# Altium footprint library ICs And Semiconductors SMD.PcbLib: 602 footprints (part 37 of 38)
Each footprint in its own frame and in the unit in brackets; x right, y up, seen from the top. Pads: shape width x height; smd on the part's side, far side on the other; paste and mask are expansions set on the pad; w line width, h text height; cw(c..) or ccw(c..) is an arc to the next point about the centre after c.
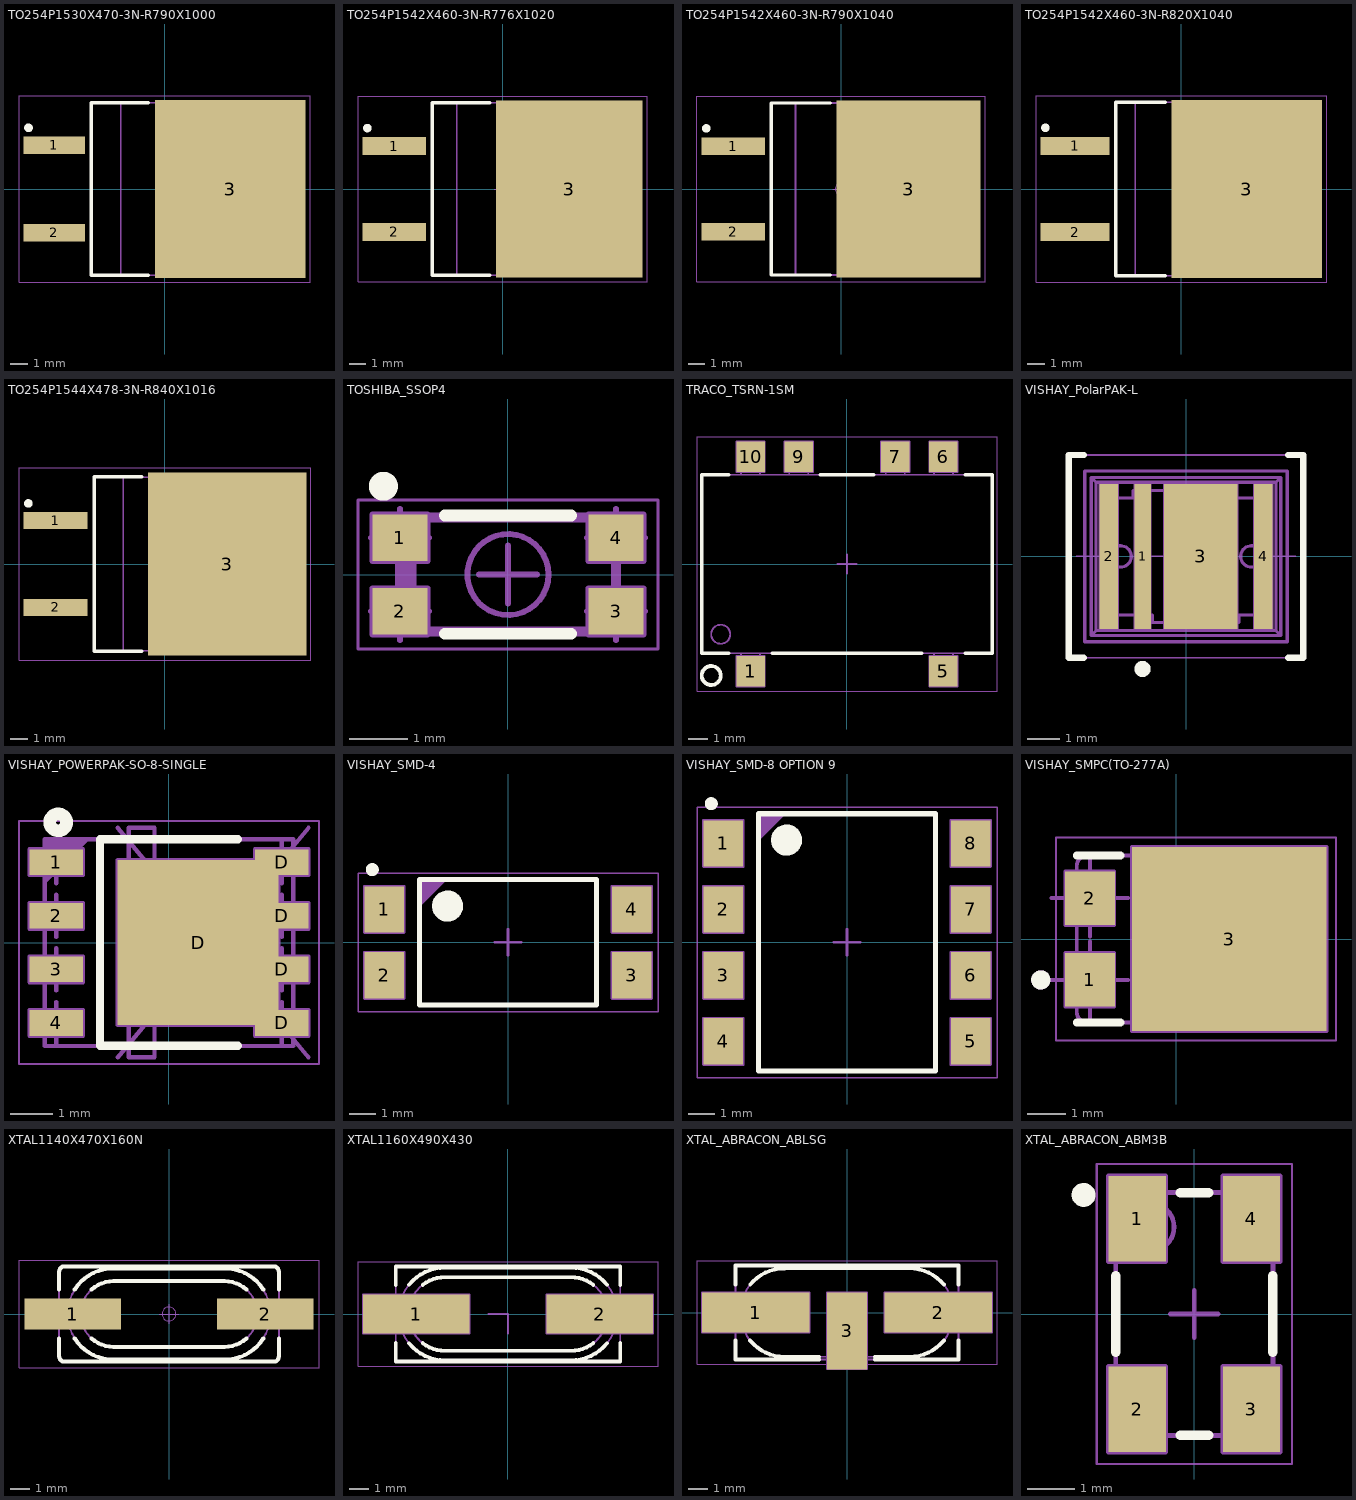
[diagram p36: the footprints below, top view; thin cyan lines are the x and y axes]

## TO254P1530X470-3N-R790X1000 [mm] "D2PAK TO-263, TO, 2.54mm pitch; 2 pin, 15.30mm L X 9.20mm W X 4.70mm H body, IPC Medium Density"
height 4.7
pads (3):
  rect 3.55x1 smd: 1(-6.4,2.54) 2(-6.4,-2.54)
  rect 8.75x10.3 smd: 3(3.8,0)
Top Overlay:
  circle w0.25: c-7.9,3.55 r0.125
  lines w0.2: -0.95,-5 -4.25,-5 -4.25,5 -0.95,5
Top Paste:
  region: 0.11,-4.45 1.43,-4.45 1.43,-2.75 0.11,-2.75
  region: 2.13,-4.45 3.45,-4.45 3.45,-2.75 2.13,-2.75
  region: 4.15,-4.45 5.47,-4.45 5.47,-2.75 4.15,-2.75
  region: 6.17,-4.45 7.49,-4.45 7.49,-2.75 6.17,-2.75
  region: 0.11,-2.05 1.43,-2.05 1.43,-0.35 0.11,-0.35
  region: 2.13,-2.05 3.45,-2.05 3.45,-0.35 2.13,-0.35
  region: 4.15,-2.05 5.47,-2.05 5.47,-0.35 4.15,-0.35
  region: 6.17,-2.05 7.49,-2.05 7.49,-0.35 6.17,-0.35
  region: 0.11,0.35 1.43,0.35 1.43,2.05 0.11,2.05
  region: 2.13,0.35 3.45,0.35 3.45,2.05 2.13,2.05
  region: 4.15,0.35 5.47,0.35 5.47,2.05 4.15,2.05
  region: 6.17,0.35 7.49,0.35 7.49,2.05 6.17,2.05
  region: 0.11,2.75 1.43,2.75 1.43,4.45 0.11,4.45
  region: 2.13,2.75 3.45,2.75 3.45,4.45 2.13,4.45
  region: 4.15,2.75 5.47,2.75 5.47,4.45 4.15,4.45
  region: 6.17,2.75 7.49,2.75 7.49,4.45 6.17,4.45
Mechanical 14:
  lines w0.1: 6.65,-5 6.98,-5 7.65,-4.258 7.65,4.258 6.98,5 6.65,5 ; 6.65,-5 6.65,5 ; 6.65,-5 -2.55,-5 -2.55,5 6.65,5
Mechanical 15:
  lines w0.05: -0.5,0 0.5,0 ; 0,-0.5 0,0.5 ; -8.45,-5.4 -8.45,5.4 8.45,5.4 8.45,-5.4 -8.45,-5.4
3D body "TO254P1524X483-3N.stp": height 4.83, standoff 0, extent -7.622,-5.08 7.623,5.08

## TO254P1542X460-3N-R776X1020 [mm] "D2PAK TO-263 TO, 2.54mm pitch; 2 pin, 15.425mm L X 9.15mm W X 4.60mm H body, IPC Medium Density"
height 4.6
pads (3):
  rect 3.75x1.05 smd: 1(-6.4,2.54) 2(-6.4,-2.54)
  rect 8.65x10.5 smd: 3(3.95,0)
Top Overlay:
  circle w0.25: c-8,3.6 r0.125
  lines w0.2: -0.75,-5.1 -4.15,-5.1 -4.15,5.1 -0.75,5.1
Top Paste:
  region: 6.3,3.26 7.6,3.26 7.6,4.66 6.3,4.66
  region: 4.3,3.26 5.6,3.26 5.6,4.66 4.3,4.66
  region: 2.3,3.26 3.6,3.26 3.6,4.66 2.3,4.66
  region: 0.3,3.26 1.6,3.26 1.6,4.66 0.3,4.66
  region: 6.3,1.28 7.6,1.28 7.6,2.68 6.3,2.68
  region: 4.3,1.28 5.6,1.28 5.6,2.68 4.3,2.68
  region: 2.3,1.28 3.6,1.28 3.6,2.68 2.3,2.68
  region: 0.3,1.28 1.6,1.28 1.6,2.68 0.3,2.68
  region: 6.3,-0.7 7.6,-0.7 7.6,0.7 6.3,0.7
  region: 4.3,-0.7 5.6,-0.7 5.6,0.7 4.3,0.7
  region: 2.3,-0.7 3.6,-0.7 3.6,0.7 2.3,0.7
  region: 0.3,-0.7 1.6,-0.7 1.6,0.7 0.3,0.7
  region: 6.3,-2.68 7.6,-2.68 7.6,-1.28 6.3,-1.28
  region: 4.3,-2.68 5.6,-2.68 5.6,-1.28 4.3,-1.28
  region: 2.3,-2.68 3.6,-2.68 3.6,-1.28 2.3,-1.28
  region: 0.3,-2.68 1.6,-2.68 1.6,-1.28 0.3,-1.28
  region: 6.3,-4.66 7.6,-4.66 7.6,-3.26 6.3,-3.26
  region: 4.3,-4.66 5.6,-4.66 5.6,-3.26 4.3,-3.26
  region: 2.3,-4.66 3.6,-4.66 3.6,-3.26 2.3,-3.26
  region: 0.3,-4.66 1.6,-4.66 1.6,-3.26 0.3,-3.26
Mechanical 14:
  lines w0.1: 6.442,-5.1 -2.708,-5.1 -2.708,5.1 6.442,5.1 ; 6.442,-5.1 6.442,5.1 ; 6.442,-5.1 6.861,-5.1 7.712,-4.157 7.712,4.157 6.861,5.1 6.442,5.1
Mechanical 15:
  lines w0.05: -0.5,0 0.5,0 ; 0,-0.5 0,0.5 ; -8.55,-5.5 8.55,-5.5 8.55,5.5 -8.55,5.5 -8.55,-5.5
3D body "TO254P1524X483-3N.stp": height 4.83, standoff 0, extent -7.622,-5.08 7.623,5.08

## TO254P1542X460-3N-R790X1040 [mm] "D2PAK TO-263, TO, 2.54mm pitch; 2 pin,15.425mm L X 9.15mm W X 4.60mm H body, IPC Medium Density"
height 4.6
pads (3):
  rect 3.75x1.05 smd: 1(-6.4,2.54) 2(-6.4,-2.54)
  rect 8.55x10.5 smd: 3(4,0)
Top Overlay:
  circle w0.25: c-8,3.6 r0.125
  lines w0.2: -0.65,-5.1 -4.15,-5.1 -4.15,5.1 -0.65,5.1
Top Paste:
  region: 0.39,-4.66 1.67,-4.66 1.67,-3.26 0.39,-3.26
  region: 2.37,-4.66 3.65,-4.66 3.65,-3.26 2.37,-3.26
  region: 4.35,-4.66 5.63,-4.66 5.63,-3.26 4.35,-3.26
  region: 6.33,-4.66 7.61,-4.66 7.61,-3.26 6.33,-3.26
  region: 0.39,-2.68 1.67,-2.68 1.67,-1.28 0.39,-1.28
  region: 2.37,-2.68 3.65,-2.68 3.65,-1.28 2.37,-1.28
  region: 4.35,-2.68 5.63,-2.68 5.63,-1.28 4.35,-1.28
  region: 6.33,-2.68 7.61,-2.68 7.61,-1.28 6.33,-1.28
  region: 0.39,-0.7 1.67,-0.7 1.67,0.7 0.39,0.7
  region: 2.37,-0.7 3.65,-0.7 3.65,0.7 2.37,0.7
  region: 4.35,-0.7 5.63,-0.7 5.63,0.7 4.35,0.7
  region: 6.33,-0.7 7.61,-0.7 7.61,0.7 6.33,0.7
  region: 0.39,1.28 1.67,1.28 1.67,2.68 0.39,2.68
  region: 2.37,1.28 3.65,1.28 3.65,2.68 2.37,2.68
  region: 4.35,1.28 5.63,1.28 5.63,2.68 4.35,2.68
  region: 6.33,1.28 7.61,1.28 7.61,2.68 6.33,2.68
  region: 0.39,3.26 1.67,3.26 1.67,4.66 0.39,4.66
  region: 2.37,3.26 3.65,3.26 3.65,4.66 2.37,4.66
  region: 4.35,3.26 5.63,3.26 5.63,4.66 4.35,4.66
  region: 6.33,3.26 7.61,3.26 7.61,4.66 6.33,4.66
Mechanical 14:
  lines w0.1: 6.442,-5.1 -2.708,-5.1 -2.708,5.1 6.442,5.1 ; 6.442,-5.1 6.442,5.1 ; 6.442,-5.1 6.861,-5.1 7.712,-4.157 7.712,4.157 6.861,5.1 6.442,5.1
Mechanical 15:
  circle w0.05: c0,0 r0.35
  lines w0.05: -0.5,0 0.5,0 ; 0,-0.5 0,0.5 ; -8.55,-5.5 8.55,-5.5 8.55,5.5 -8.55,5.5 -8.55,-5.5
3D body "TO254P1542X460-3N-R790X1040.stp": height 4.6, standoff 0, extent -7.622,-5.08 7.623,5.08

## TO254P1542X460-3N-R820X1040 [mm] "D2PAK TO-263, TO, 2.54mm pitch; 2 pin,15.425mm L X 9.15mm W X 4.60mm H body, IPC Medium Density"
height 4.6
pads (3):
  rect 4.05x1.05 smd: 1(-6.25,2.54) 2(-6.25,-2.54)
  rect 8.85x10.5 smd: 3(3.85,0)
Top Overlay:
  circle w0.25: c-8,3.6 r0.125
  lines w0.2: -0.95,-5.1 -3.85,-5.1 -3.85,5.1 -0.95,5.1
Top Paste:
  region: 6.24,3.26 7.58,3.26 7.58,4.66 6.24,4.66
  region: 4.2,3.26 5.54,3.26 5.54,4.66 4.2,4.66
  region: 2.16,3.26 3.5,3.26 3.5,4.66 2.16,4.66
  region: 0.12,3.26 1.46,3.26 1.46,4.66 0.12,4.66
  region: 6.24,1.28 7.58,1.28 7.58,2.68 6.24,2.68
  region: 4.2,1.28 5.54,1.28 5.54,2.68 4.2,2.68
  region: 2.16,1.28 3.5,1.28 3.5,2.68 2.16,2.68
  region: 0.12,1.28 1.46,1.28 1.46,2.68 0.12,2.68
  region: 6.24,-0.7 7.58,-0.7 7.58,0.7 6.24,0.7
  region: 4.2,-0.7 5.54,-0.7 5.54,0.7 4.2,0.7
  region: 2.16,-0.7 3.5,-0.7 3.5,0.7 2.16,0.7
  region: 0.12,-0.7 1.46,-0.7 1.46,0.7 0.12,0.7
  region: 6.24,-2.68 7.58,-2.68 7.58,-1.28 6.24,-1.28
  region: 4.2,-2.68 5.54,-2.68 5.54,-1.28 4.2,-1.28
  region: 2.16,-2.68 3.5,-2.68 3.5,-1.28 2.16,-1.28
  region: 0.12,-2.68 1.46,-2.68 1.46,-1.28 0.12,-1.28
  region: 6.24,-4.66 7.58,-4.66 7.58,-3.26 6.24,-3.26
  region: 4.2,-4.66 5.54,-4.66 5.54,-3.26 4.2,-3.26
  region: 2.16,-4.66 3.5,-4.66 3.5,-3.26 2.16,-3.26
  region: 0.12,-4.66 1.46,-4.66 1.46,-3.26 0.12,-3.26
Mechanical 14:
  lines w0.1: 6.442,-5.1 6.861,-5.1 7.712,-4.157 7.712,4.157 6.861,5.1 6.442,5.1 ; 6.442,-5.1 6.442,5.1 ; 6.442,-5.1 -2.708,-5.1 -2.708,5.1 6.442,5.1
Mechanical 15:
  circle w0.05: c0,0 r0.35
  lines w0.05: -0.5,0 0.5,0 ; 0,-0.5 0,0.5 ; -8.55,-5.5 -8.55,5.5 8.55,5.5 8.55,-5.5 -8.55,-5.5
3D body "TO254P1542X460-3N-R820X1040.stp": height 4.6, standoff 0, extent -7.71,-5.08 7.71,5.083

## TO254P1544X478-3N-R840X1016 [mm] "D2PAK TO-263A,TO, 2.54mm pitch; 2 pin,1 5.435mm L X 9.27mm W X 4.78mm H body, IPC Medium Density"
height 4.78
pads (3):
  rect 3.75x1 smd: 1(-6.4,2.54) 2(-6.4,-2.54)
  rect 9.3x10.75 smd: 3(3.65,0)
Top Overlay:
  circle w0.25: c-8,3.55 r0.125
  lines w0.2: -1.35,-5.1 -4.15,-5.1 -4.15,5.1 -1.35,5.1
Top Paste:
  region: 6.18,3.33 6.18,4.75 7.6,4.75 7.6,3.33
  region: 4.02,3.33 4.02,4.75 5.44,4.75 5.44,3.33
  region: 1.86,3.33 1.86,4.75 3.28,4.75 3.28,3.33
  region: -0.3,3.33 -0.3,4.75 1.12,4.75 1.12,3.33
  region: 6.18,1.31 6.18,2.73 7.6,2.73 7.6,1.31
  region: 4.02,1.31 4.02,2.73 5.44,2.73 5.44,1.31
  region: 1.86,1.31 1.86,2.73 3.28,2.73 3.28,1.31
  region: -0.3,1.31 -0.3,2.73 1.12,2.73 1.12,1.31
  region: 6.18,-0.71 6.18,0.71 7.6,0.71 7.6,-0.71
  region: 4.02,-0.71 4.02,0.71 5.44,0.71 5.44,-0.71
  region: 1.86,-0.71 1.86,0.71 3.28,0.71 3.28,-0.71
  region: -0.3,-0.71 -0.3,0.71 1.12,0.71 1.12,-0.71
  region: 6.18,-2.73 6.18,-1.31 7.6,-1.31 7.6,-2.73
  region: 4.02,-2.73 4.02,-1.31 5.44,-1.31 5.44,-2.73
  region: 1.86,-2.73 1.86,-1.31 3.28,-1.31 3.28,-2.73
  region: -0.3,-2.73 -0.3,-1.31 1.12,-1.31 1.12,-2.73
  region: 6.18,-4.75 6.18,-3.33 7.6,-3.33 7.6,-4.75
  region: 4.02,-4.75 4.02,-3.33 5.44,-3.33 5.44,-4.75
  region: 1.86,-4.75 1.86,-3.33 3.28,-3.33 3.28,-4.75
  region: -0.3,-4.75 -0.3,-3.33 1.12,-3.33 1.12,-4.75
Mechanical 14:
  lines w0.1: 6.828,-5.08 -2.442,-5.08 -2.442,5.08 6.828,5.08 ; 6.828,-5.08 6.828,5.08 ; 6.828,-5.08 7.121,-5.08 7.717,-4.419 7.717,4.419 7.121,5.08 6.828,5.08
Mechanical 15:
  lines w0.05: -0.5,0 0.5,0 ; 0,-0.5 0,0.5 ; -8.55,-5.65 8.55,-5.65 8.55,5.65 -8.55,5.65 -8.55,-5.65
3D body "TO254P1524X483-3N.stp": height 4.83, standoff 0, extent -7.622,-5.08 7.623,5.08

## TOSHIBA_SSOP4 [mm] "TOSHIBA SSOP4, 1.27mm Pitch; 4 Pin, 2.04mm L X 3.8mm W X 1.8mm H Body"
height 1.8
pads (4):
  rect 0.95x0.8 smd: 1(-1.865,0.635) 2(-1.865,-0.635) 3(1.865,-0.635) 4(1.865,0.635)
Top Overlay:
  circle w0.25: c-2.15,1.525 r0.125
  lines w0.2: -1.09,-1.02 1.09,-1.02 ; -1.09,1.02 1.09,1.02
Mechanical 8:
  lines w0.1: -2.365,-0.635 -1.865,-0.635 ; -2.365,0.635 -1.865,0.635 ; -2.1,0.785 -2.1,1.035 ; -1.865,-1.135 -1.865,-0.635 ; -1.865,-0.135 -1.865,-0.635 ; -1.865,0.135 -1.865,0.635 ; -1.865,1.135 -1.865,0.635 ; -1.365,-0.635 -1.865,-0.635 ; -1.365,0.635 -1.865,0.635 ; -0.5,0 0,0 ; 0,-0.5 0,0 ; 0,0.5 0,0 ; 0.5,0 0,0 ; 1.365,-0.635 1.865,-0.635 ; 1.365,0.635 1.865,0.635 ; 1.865,-1.135 1.865,-0.635 ; 1.865,-0.135 1.865,-0.635 ; 1.865,0.135 1.865,0.635 ; 1.865,1.135 1.865,0.635 ; 2.365,-0.635 1.865,-0.635 ; 2.365,0.635 1.865,0.635 ; -2.34,-1.035 -1.39,-1.035 -1.39,-0.235 -2.34,-0.235 -2.34,-1.035 ; -2.34,0.235 -1.39,0.235 -1.39,1.035 -2.34,1.035 -2.34,0.235 ; 1.39,-1.035 2.34,-1.035 2.34,-0.235 1.39,-0.235 1.39,-1.035 ; 1.39,0.235 2.34,0.235 2.34,1.035 1.39,1.035 1.39,0.235
Mechanical 14:
  circle w0.1: c0,0 r0.7
  lines w0.1: -1.9,-0.785 -2.1,-0.785 -2.1,-0.485 -1.9,-0.485 ; -1.9,0.485 -2.1,0.485 -2.1,0.785 -1.9,0.785 ; -1.78,-0.95 -1.78,0.95 ; -1.73,-0.95 -1.73,0.95 ; -1.68,-0.95 -1.68,0.95 ; 1.9,-0.785 2.1,-0.785 2.1,-0.485 1.9,-0.485 ; 1.9,0.485 2.1,0.485 2.1,0.785 1.9,0.785 ; -1.9,-1.02 1.9,-1.02 ; -1.9,-1.02 -1.9,1.02 ; -1.9,-1.02 -1.838,-0.958 ; -1.9,1.02 1.9,1.02 ; -1.9,1.02 -1.838,0.958 ; -1.838,-0.958 -1.63,-0.95 ; -1.838,-0.958 -1.838,0.958 ; -1.838,0.958 -1.63,0.95 ; -1.63,-0.95 1.83,-0.95 ; -1.63,-0.95 -1.63,0.95 ; -1.63,0.95 1.83,0.95 ; 1.83,-0.95 1.83,0.95 ; 1.83,-0.95 1.9,-1.02 ; 1.83,0.95 1.9,1.02 ; 1.9,-1.02 1.9,1.02
Mechanical 15:
  lines w0.05: -2.59,-1.285 -2.59,1.285 2.59,1.285 2.59,-1.285 -2.59,-1.285
3D body "TOSHIBA_SSOP4.stp": height 1.8, standoff 0, extent -2.1,-1.02 2.1,1.02

## TRACO_TSRN-1SM [mm] "TSRN-1SM Case, 6-Pin, Pitch 2.13mm, Body 15.2x9.3mm"
height 7.4
pads (6):
  rect 1.5x1.61 smd: 1(-5.08,-5.655) 5(5.08,-5.655) 6(5.08,5.655) 7(2.54,5.655) 9(-2.54,5.655) 10(-5.08,5.655)
Top Overlay:
  circle w0.2: c-7.15,-5.875 r0.5
  lines w0.2: -6.225,-4.7 -7.65,-4.7 -7.65,4.7 -6.225,4.7 ; -3.935,-4.7 3.935,-4.7 ; -1.395,4.7 1.395,4.7 ; 6.225,-4.7 7.65,-4.7 7.65,4.7 6.225,4.7
Mechanical 8:
  lines w0.1: -5.58,-5.655 -5.08,-5.655 ; -5.58,5.655 -5.08,5.655 ; -5.08,-6.155 -5.08,-5.655 ; -5.08,-5.155 -5.08,-5.655 ; -5.08,5.155 -5.08,5.655 ; -5.08,6.155 -5.08,5.655 ; -4.58,-5.655 -5.08,-5.655 ; -4.58,5.655 -5.08,5.655 ; -3.04,5.655 -2.54,5.655 ; -2.54,5.155 -2.54,5.655 ; -2.54,6.155 -2.54,5.655 ; -2.04,5.655 -2.54,5.655 ; -0.5,0 0,0 ; 0,-0.5 0,0 ; 0,0.5 0,0 ; 0.5,0 0,0 ; 2.04,5.655 2.54,5.655 ; 2.54,5.155 2.54,5.655 ; 2.54,6.155 2.54,5.655 ; 3.04,5.655 2.54,5.655 ; 4.58,-5.655 5.08,-5.655 ; 4.58,5.655 5.08,5.655 ; 5.08,-6.155 5.08,-5.655 ; 5.08,-5.155 5.08,-5.655 ; 5.08,5.155 5.08,5.655 ; 5.08,6.155 5.08,5.655 ; 5.58,-5.655 5.08,-5.655 ; 5.58,5.655 5.08,5.655 ; -5.83,-6.46 -4.33,-6.46 -4.33,-4.85 -5.83,-4.85 -5.83,-6.46 ; -5.83,4.85 -4.33,4.85 -4.33,6.46 -5.83,6.46 -5.83,4.85 ; -3.29,4.85 -1.79,4.85 -1.79,6.46 -3.29,6.46 -3.29,4.85 ; 1.79,4.85 3.29,4.85 3.29,6.46 1.79,6.46 1.79,4.85 ; 4.33,-6.46 5.83,-6.46 5.83,-4.85 4.33,-4.85 4.33,-6.46 ; 4.33,4.85 5.83,4.85 5.83,6.46 4.33,6.46 4.33,4.85
Mechanical 14:
  circle w0.1: c-6.65,-3.7 r0.5
  lines w0.1: -5.58,-4.7 -5.58,-5.453 -5.33,-5.453 -5.33,-6.063 -4.83,-6.063 -4.83,-5.453 -4.58,-5.453 -4.58,-4.7 ; -5.58,4.7 -5.58,5.453 -5.33,5.453 -5.33,6.063 -4.83,6.063 -4.83,5.453 -4.58,5.453 -4.58,4.7 ; -3.04,4.7 -3.04,5.453 -2.79,5.453 -2.79,6.063 -2.29,6.063 -2.29,5.453 -2.04,5.453 -2.04,4.7 ; 2.04,4.7 2.04,5.453 2.29,5.453 2.29,6.063 2.79,6.063 2.79,5.453 3.04,5.453 3.04,4.7 ; 4.58,-4.7 4.58,-5.453 4.83,-5.453 4.83,-6.063 5.33,-6.063 5.33,-5.453 5.58,-5.453 5.58,-4.7 ; 4.58,4.7 4.58,5.453 4.83,5.453 4.83,6.063 5.33,6.063 5.33,5.453 5.58,5.453 5.58,4.7 ; -7.65,-4.7 -7.65,4.7 7.65,4.7 7.65,-4.7 -7.65,-4.7
Mechanical 15:
  lines w0.05: -7.9,-6.71 -7.9,6.71 7.9,6.71 7.9,-6.71 -7.9,-6.71
3D body "TRACO_TSRN-1SM.stp": height 7.4, standoff 0, extent -7.65,-6.062 7.65,6.063

## VISHAY_PolarPAK-L [mm] "VISHAY PolarPAK Case Option L, 10-Leads - Body 6.3x5.31mm"
height 0.85
pads (4):
  rect 0.51x4.52 smd: 1(-1.35,0)
  rect 0.58x4.52 smd: 2(-2.405,0) 4(2.405,0)
  rect 2.29x4.52 smd: 3(0.46,0)
Top Overlay:
  circle w0.25: c-1.35,-3.5 r0.125
  lines w0.2: -3.175,-3.155 -3.65,-3.155 -3.65,3.155 -3.175,3.155 ; 3.175,-3.155 3.65,-3.155 3.65,3.155 3.175,3.155
Mechanical 8:
  lines w0.05: -3.405,0 -2.405,0 -2.405,-1 ; -1.35,-1 -1.35,0 -0.35,0 ; 0.46,-1 0.46,0 1.46,0 ; 2.405,-1 2.405,0 3.405,0 ; -2.695,-2.26 -2.695,2.26 -2.115,2.26 -2.115,-2.26 -2.695,-2.26 ; -1.605,-2.26 -1.605,2.26 -1.095,2.26 -1.095,-2.26 -1.605,-2.26 ; -0.685,-2.26 -0.685,2.26 1.605,2.26 1.605,-2.26 -0.685,-2.26 ; 2.115,-2.26 2.115,2.26 2.695,2.26 2.695,-2.26 2.115,-2.26
  text "D" at -2.667,-3.155 h0.76
  text "G" at -1.651,-3.155 h0.76
  text "S" at -0.508,-3.155 h0.76
  text "S" at 0.762,-3.155 h0.76
  text "D" at 2.159,-3.155 h0.76
  text "D" at 2.159,2.455 h0.76
  text "S" at 0.762,2.455 h0.76
  text "S" at -0.508,2.455 h0.76
  text "G" at -1.651,2.455 h0.76
  text "D" at -2.667,2.455 h0.76
Mechanical 14:
  lines w0.1: -2.95,-2.455 -2.8,-2.305 ; -2.95,-2.455 2.95,-2.455 ; -2.95,-2.455 -2.95,2.455 ; -2.95,2.455 -2.8,2.305 ; -2.95,2.455 2.95,2.455 ; -2.8,-2.305 2.8,-2.305 ; -2.8,-2.305 -2.8,2.305 ; -2.8,2.305 2.8,2.305 ; 2.8,-2.305 2.95,-2.455 ; 2.8,-2.305 2.8,2.305 ; 2.8,2.305 2.95,2.455 ; 2.95,-2.455 2.95,2.455 ; -3.15,-2.655 -3.15,2.655 3.15,2.655 3.15,-2.655 -3.15,-2.655 ; -2.25,-1.82 -1.05,-1.82 -1.05,-2.05 1.65,-2.05 1.65,-1.82 2.25,-1.82 2.25,-0.33 2.03,-0.33 cw(c2.03,0) 2.03,0.33 2.25,0.33 2.25,1.82 1.05,1.82 1.05,2.05 -1.65,2.05 -1.65,1.82 -2.25,1.82 -2.25,0.33 -2.03,0.33 cw(c-2.03,0) -2.03,-0.33 -2.25,-0.33 -2.25,-1.82
Mechanical 15:
  lines w0.05: -3.65,-3.155 -3.65,3.155 3.65,3.155 3.65,-3.155 -3.65,-3.155
3D body "SiE810DF-T1-E3.stp": height 0.85, standoff 0, extent -3.15,-2.655 3.15,2.655

## VISHAY_POWERPAK-SO-8-SINGLE [mm] "SOIC, 1.27mm Pitch, 8 Pin, Body 5.89mm W X 4.9mm L X 1.12mm H, PowerPAK® SO-8, (SINGLE)"
height 1.12
pads (9):
  rect 1.27x0.61 smd: 1(-2.67,1.905) 2(-2.67,0.635) 3(-2.67,-0.635) 4(-2.67,-1.905) D(2.67,-1.905) D(2.67,-0.635) D(2.67,0.635) D(2.67,1.905)
  rect 3.81x3.91 smd: D(0.69,0)
Top Overlay:
  circle w0.3: c-2.625,2.85 r0.2
  lines w0.2: 1.635,-2.45 -1.635,-2.45 -1.635,2.45 1.635,2.45
Mechanical 8:
  lines w0.1: -3.17,-1.905 -2.67,-1.905 ; -3.17,-0.635 -2.67,-0.635 ; -3.17,0.635 -2.67,0.635 ; -3.17,1.905 -2.67,1.905 ; -2.67,-2.405 -2.67,-1.905 ; -2.67,-1.405 -2.67,-1.905 ; -2.67,-1.135 -2.67,-0.635 ; -2.67,-0.135 -2.67,-0.635 ; -2.67,0.135 -2.67,0.635 ; -2.67,1.135 -2.67,0.635 ; -2.67,1.405 -2.67,1.905 ; -2.67,2.405 -2.67,1.905 ; -2.17,-1.905 -2.67,-1.905 ; -2.17,-0.635 -2.67,-0.635 ; -2.17,0.635 -2.67,0.635 ; -2.17,1.905 -2.67,1.905 ; -1.215,-2.72 1.045,0 ; -1.215,2.72 1.045,0 ; -0.354,-0.354 0,0 ; -0.354,0.354 0,0 ; 0.19,0 0.69,0 ; 0.354,-0.354 0,0 ; 0.354,0.354 0,0 ; 0.69,-0.5 0.69,0 ; 0.69,0.5 0.69,0 ; 1.19,0 0.69,0 ; 2.17,-1.905 2.67,-1.905 ; 2.17,-0.635 2.67,-0.635 ; 2.17,0.635 2.67,0.635 ; 2.17,1.905 2.67,1.905 ; 2.67,-2.405 2.67,-1.905 ; 2.67,-1.405 2.67,-1.905 ; 2.67,-1.135 2.67,-0.635 ; 2.67,-0.135 2.67,-0.635 ; 2.67,0.135 2.67,0.635 ; 2.67,1.135 2.67,0.635 ; 2.67,1.405 2.67,1.905 ; 2.67,2.405 2.67,1.905 ; 3.17,-1.905 2.67,-1.905 ; 3.17,-0.635 2.67,-0.635 ; 3.17,0.635 2.67,0.635 ; 3.17,1.905 2.67,1.905 ; 3.305,-2.72 1.045,0 ; 3.305,2.72 1.045,0 ; -1.215,-1.955 -1.215,1.955 ; -1.215,-1.955 -0.955,-1.955 -0.955,-2.72 -0.345,-2.72 -0.345,-1.955 2.035,-1.955 ; -1.215,-1.955 2.595,-1.955 ; -1.215,1.955 -0.955,1.955 -0.955,2.72 -0.345,2.72 -0.345,1.955 2.035,1.955 ; -1.215,1.955 2.595,1.955 ; 2.035,-1.955 2.035,-2.21 3.305,-2.21 3.305,-1.6 2.595,-1.6 ; 2.035,-1.955 2.595,-1.955 ; 2.035,-1.955 2.035,-1.6 2.595,-1.6 ; 2.035,1.955 2.035,2.21 3.305,2.21 3.305,1.6 2.595,1.6 ; 2.035,1.955 2.595,1.955 ; 2.035,1.955 2.035,1.6 2.595,1.6 ; 2.595,-1.955 2.595,-1.6 ; 2.595,-1.6 2.595,-0.94 ; 2.595,-0.94 3.305,-0.94 3.305,-0.33 2.595,-0.33 ; 2.595,-0.94 2.035,-0.94 2.035,-0.33 2.595,-0.33 ; 2.595,-0.94 2.595,-0.33 ; 2.595,-0.33 2.595,0.33 ; 2.595,0.33 3.305,0.33 3.305,0.94 2.595,0.94 ; 2.595,0.33 2.035,0.33 2.035,0.94 2.595,0.94 ; 2.595,0.33 2.595,0.94 ; 2.595,0.94 2.595,1.6 ; 2.595,1.6 2.595,1.955 ; -3.305,-2.21 -3.305,-1.6 -2.035,-1.6 -2.035,-2.21 -3.305,-2.21 ; -3.305,-0.94 -3.305,-0.33 -2.035,-0.33 -2.035,-0.94 -3.305,-0.94 ; -3.305,0.33 -3.305,0.94 -2.035,0.94 -2.035,0.33 -3.305,0.33 ; -3.305,1.6 -3.305,2.21 -2.035,2.21 -2.035,1.6 -3.305,1.6
Mechanical 14:
  lines w0.1: -2.945,1.45 -1.945,2.45 ; -2.945,1.55 -2.045,2.45 ; -2.945,1.65 -2.145,2.45 ; -2.945,1.75 -2.245,2.45 ; -2.945,1.85 -2.345,2.45 ; -2.945,1.95 -2.445,2.45 ; -2.945,2.05 -2.545,2.45 ; -2.945,2.15 -2.645,2.45 ; -2.945,2.25 -2.745,2.45 ; -2.945,2.35 -2.845,2.45 ; -2.945,-2.45 2.945,-2.45 2.945,2.45 -2.945,2.45 -2.945,-2.45
Mechanical 15:
  lines w0.05: -3.555,-2.88 -3.555,2.88 3.555,2.88 3.555,-2.88 -3.555,-2.88
3D body "VISHAY_POWERPAK-SO-8-SINGLE.stp": height 1.12, standoff 0, extent -3.125,-2.54 3.125,2.54

## VISHAY_SMD-4 [mm] "VISHAY SMD-4 Package"
height 3.9
pads (4):
  rect 1.52x1.78 smd: 1(-4.765,1.27) 2(-4.765,-1.27) 3(4.765,-1.27) 4(4.765,1.27)
Top Overlay:
  circle w0.25: c-5.225,2.8 r0.125
  circle w0.6: c-2.325,1.4 r0.3
  lines w0.2: -3.405,-2.415 3.405,-2.415 3.405,2.415 -3.405,2.415 -3.405,-2.415
Mechanical 8:
  lines w0.1: -5.265,-1.27 -4.765,-1.27 ; -5.265,1.27 -4.765,1.27 ; -4.765,-1.77 -4.765,-1.27 ; -4.765,-0.77 -4.765,-1.27 ; -4.765,0.77 -4.765,1.27 ; -4.765,1.77 -4.765,1.27 ; -4.265,-1.27 -4.765,-1.27 ; -4.265,1.27 -4.765,1.27 ; -0.5,0 0,0 ; 0,-0.5 0,0 ; 0,0.5 0,0 ; 0.5,0 0,0 ; 4.265,-1.27 4.765,-1.27 ; 4.265,1.27 4.765,1.27 ; 4.765,-1.77 4.765,-1.27 ; 4.765,-0.77 4.765,-1.27 ; 4.765,0.77 4.765,1.27 ; 4.765,1.77 4.765,1.27 ; 5.265,-1.27 4.765,-1.27 ; 5.265,1.27 4.765,1.27 ; -5.525,-2.16 -5.525,-0.38 -4.005,-0.38 -4.005,-2.16 -5.525,-2.16 ; -5.525,0.38 -5.525,2.16 -4.005,2.16 -4.005,0.38 -5.525,0.38 ; 4.005,-2.16 4.005,-0.38 5.525,-0.38 5.525,-2.16 4.005,-2.16 ; 4.005,0.38 4.005,2.16 5.525,2.16 5.525,0.38 4.005,0.38
Mechanical 14:
  lines w0.1: -3.405,1.415 -2.405,2.415 ; -3.405,1.515 -2.505,2.415 ; -3.405,1.615 -2.605,2.415 ; -3.405,1.715 -2.705,2.415 ; -3.405,1.815 -2.805,2.415 ; -3.405,1.915 -2.905,2.415 ; -3.405,2.015 -3.005,2.415 ; -3.405,2.115 -3.105,2.415 ; -3.405,2.215 -3.205,2.415 ; -3.405,2.315 -3.305,2.415 ; -3.405,-2.415 3.405,-2.415 3.405,2.415 -3.405,2.415 -3.405,-2.415
Mechanical 15:
  lines w0.05: -5.775,-2.665 -5.775,2.665 5.775,2.665 5.775,-2.665 -5.775,-2.665
3D body "VISHAY_SMD-4.stp": height 3.9, standoff 0, extent -5.1,-2.415 5.1,2.415

## VISHAY_SMD-8 OPTION 9 [mm] "SOIC, 2.54mm Pitch, 8 Pin, Body 6.64mm W X 9.77mm L X 4.059mm H, VISHAY SMD-8 Option 9"
height 4.059
pads (8):
  rect 1.52x1.78 smd: 1(-4.763,3.81) 2(-4.763,1.27) 3(-4.763,-1.27) 4(-4.763,-3.81) 5(4.763,-3.81) 6(4.763,-1.27) 7(4.763,1.27) 8(4.763,3.81)
Top Overlay:
  circle w0.25: c-5.225,5.34 r0.125
  circle w0.6: c-2.325,3.94 r0.3
  lines w0.2: -3.405,-4.955 -3.405,4.955 3.405,4.955 3.405,-4.955 -3.405,-4.955
Mechanical 8:
  lines w0.1: -5.263,-3.81 -4.763,-3.81 ; -5.263,-1.27 -4.763,-1.27 ; -5.263,1.27 -4.763,1.27 ; -5.263,3.81 -4.763,3.81 ; -4.763,-4.31 -4.763,-3.81 ; -4.763,-3.31 -4.763,-3.81 ; -4.763,-1.77 -4.763,-1.27 ; -4.763,-0.77 -4.763,-1.27 ; -4.763,0.77 -4.763,1.27 ; -4.763,1.77 -4.763,1.27 ; -4.763,3.31 -4.763,3.81 ; -4.763,4.31 -4.763,3.81 ; -4.263,-3.81 -4.763,-3.81 ; -4.263,-1.27 -4.763,-1.27 ; -4.263,1.27 -4.763,1.27 ; -4.263,3.81 -4.763,3.81 ; -0.5,0 0,0 ; 0,-0.5 0,0 ; 0,0.5 0,0 ; 0.5,0 0,0 ; 4.263,-3.81 4.763,-3.81 ; 4.263,-1.27 4.763,-1.27 ; 4.263,1.27 4.763,1.27 ; 4.263,3.81 4.763,3.81 ; 4.763,-4.31 4.763,-3.81 ; 4.763,-3.31 4.763,-3.81 ; 4.763,-1.77 4.763,-1.27 ; 4.763,-0.77 4.763,-1.27 ; 4.763,0.77 4.763,1.27 ; 4.763,1.77 4.763,1.27 ; 4.763,3.31 4.763,3.81 ; 4.763,4.31 4.763,3.81 ; 5.263,-3.81 4.763,-3.81 ; 5.263,-1.27 4.763,-1.27 ; 5.263,1.27 4.763,1.27 ; 5.263,3.81 4.763,3.81 ; -5.525,-4.7 -5.525,-2.92 -4,-2.92 -4,-4.7 -5.525,-4.7 ; -5.525,-2.16 -5.525,-0.38 -4,-0.38 -4,-2.16 -5.525,-2.16 ; -5.525,0.38 -5.525,2.16 -4,2.16 -4,0.38 -5.525,0.38 ; -5.525,2.92 -4,2.92 -4,4.7 -5.525,4.7 -5.525,2.92 ; 4,-4.7 5.525,-4.7 5.525,-2.92 4,-2.92 4,-4.7 ; 4,-2.16 5.525,-2.16 5.525,-0.38 4,-0.38 4,-2.16 ; 4,0.38 5.525,0.38 5.525,2.16 4,2.16 4,0.38 ; 4,2.92 5.525,2.92 5.525,4.7 4,4.7 4,2.92
Mechanical 14:
  lines w0.1: -3.405,3.955 -2.405,4.955 ; -3.405,4.055 -2.505,4.955 ; -3.405,4.155 -2.605,4.955 ; -3.405,4.255 -2.705,4.955 ; -3.405,4.355 -2.805,4.955 ; -3.405,4.455 -2.905,4.955 ; -3.405,4.555 -3.005,4.955 ; -3.405,4.655 -3.105,4.955 ; -3.405,4.755 -3.205,4.955 ; -3.405,4.855 -3.305,4.955 ; -3.405,-4.955 -3.405,4.955 3.405,4.955 3.405,-4.955 -3.405,-4.955
Mechanical 15:
  lines w0.05: -5.775,-5.205 -5.775,5.205 5.775,5.205 5.775,-5.205 -5.775,-5.205
3D body "VISHAY_SMD-8 OPTION 9.stp": height 4.06, standoff 0, extent -5.015,-4.955 5.015,4.955

## VISHAY_SMPC(TO-277A) [mm] "TO-277A (SMPC), 3-Leads, Pitch 2.13mm, Body 6.1x4.3mm"
height 1.2
pads (3):
  rect 1.3x1.4 smd: 1(-2.247,-1.065) 2(-2.247,1.065)
  rect 5.07x4.8 smd: 3(1.383,0)
Top Overlay:
  circle w0.25: c-3.529,-1.067 r0.125
  lines w0.2: -2.593,-2.175 -1.452,-2.175 ; -2.593,2.175 -1.452,2.175
Mechanical 8:
  lines w0.1: -3.247,-1.065 -2.247,-1.065 ; -3.247,1.065 -2.247,1.065 ; -2.247,-2.065 -2.247,-1.065 ; -2.247,-0.065 -2.247,-1.065 ; -2.247,0.065 -2.247,1.065 ; -2.247,2.065 -2.247,1.065 ; -1.247,-1.065 -2.247,-1.065 ; -1.247,1.065 -2.247,1.065 ; -1,0 0,0 ; 0,-1 0,0 ; 0,1 0,0 ; 0.383,0 1.383,0 ; 1,0 0,0 ; 1.383,-1 1.383,0 ; 1.383,1 1.383,0 ; 2.383,0 1.383,0 ; -2.882,-1.765 -1.612,-1.765 -1.612,-0.365 -2.882,-0.365 -2.882,-1.765 ; -2.882,0.365 -1.612,0.365 -1.612,1.765 -2.882,1.765 -2.882,0.365 ; -1.152,-2.4 -1.152,2.4 3.918,2.4 3.918,-2.4 -1.152,-2.4
Mechanical 14:
  circle w0.25: c-3.529,-1.067 r0.125
  lines w0.1: -2.593,-1.74 -2.843,-1.74 -2.843,-0.39 -2.593,-0.39 ; -2.593,0.39 -2.843,0.39 -2.843,1.74 -2.593,1.74 ; -0.993,-2.175 -0.993,-2.375 -0.243,-2.375 -0.243,-2.175 ; -0.993,2.175 -0.993,2.375 -0.243,2.375 -0.243,2.175 ; 3.557,-1.1 3.807,-1.1 3.807,1.1 3.557,1.1 ; -2.593,-1.9 ccw(c-2.318,-1.9) -2.318,-2.175 3.282,-2.175 ccw(c3.282,-1.9) 3.557,-1.9 3.557,1.9 ccw(c3.282,1.9) 3.282,2.175 -2.318,2.175 ccw(c-2.318,1.9) -2.593,1.9 -2.593,-1.9
Mechanical 15:
  lines w0.05: -3.132,-2.65 4.168,-2.65 4.168,2.65 -3.132,2.65 -3.132,-2.65
3D body "VISHAY_SMPC(TO-277A).stp": height 1.2, standoff 0, extent -2.843,-2.375 3.807,2.375

## XTAL1140X470X160N [mm] "HC/49US Crystal;11.40mm L X 4.70mm W X 1.60mm H"
height 1.6
pads (2):
  rect 4.85x1.55 smd: 1(-4.85,0) 2(4.85,0)
Top Overlay:
  lines w0.2: -5.525,-1.225 -5.525,-2.15 ccw(c-5.275,-2.15) -5.275,-2.4 5.275,-2.4 ccw(c5.275,-2.15) 5.525,-2.15 5.525,-1.225 ; -5.525,1.225 -5.525,2.15 cw(c-5.275,2.15) -5.275,2.4 5.275,2.4 cw(c5.275,2.15) 5.525,2.15 5.525,1.225 ; -4.747,-1.225 ccw(c-2.8,0) -2.8,-2.3 2.8,-2.3 ccw(c2.8,0) 4.747,-1.225 ; -4.747,1.225 cw(c-2.8,0) -2.8,2.3 2.8,2.3 cw(c2.8,0) 4.747,1.225 ; -3.905,-1.225 ccw(c-2.8,0) -2.8,-1.65 2.8,-1.65 ccw(c2.8,0) 3.905,-1.225 ; -3.905,1.225 cw(c-2.8,0) -2.8,1.65 2.8,1.65 cw(c2.8,0) 3.905,1.225
Mechanical 14:
  lines w0.1: -5.525,-2.15 ccw(c-5.275,-2.15) -5.275,-2.4 5.275,-2.4 ccw(c5.275,-2.15) 5.525,-2.15 5.525,2.15 ccw(c5.275,2.15) 5.275,2.4 -5.275,2.4 ccw(c-5.275,2.15) -5.525,2.15 -5.525,-2.15 ; -2.8,-2.3 cw(c-2.8,0) -2.8,2.3 2.8,2.3 cw(c2.8,0) 2.8,-2.3 -2.8,-2.3 ; -2.8,-1.65 cw(c-2.8,0) -2.8,1.65 2.8,1.65 cw(c2.8,0) 2.8,-1.65 -2.8,-1.65
Mechanical 15:
  circle w0.05: c0,0 r0.35
  lines w0.05: -0.5,0 0.5,0 ; 0,-0.5 0,0.5 ; -7.55,-2.7 7.55,-2.7 7.55,2.7 -7.55,2.7 -7.55,-2.7
3D body "XTAL1105X470X160N.stp": height 1.6, standoff 0, extent -6.35,-2.4 6.35,2.4

## XTAL1160X490X430 [mm] "HC49/4H SMX Case, SMD Cristal, Body 11.6x4.9mm"
height 4.3
pads (2):
  rect 5.5x2 smd: 1(-4.75,0) 2(4.75,0)
Top Overlay:
  lines w0.2: -5.8,-1.5 -5.8,-2.45 5.8,-2.45 5.8,-1.5 ; -5.8,1.5 -5.8,2.45 5.8,2.45 5.8,1.5 ; -5.114,-1.512 ccw(c-3.25,0) -3.25,-2.4 3.25,-2.4 ccw(c3.25,0) 5.114,-1.512 ; -5.114,1.512 cw(c-3.25,0) -3.25,2.4 3.25,2.4 cw(c3.25,0) 5.114,1.512 ; -4.406,-1.508 ccw(c-3.25,0) -3.25,-1.9 3.25,-1.9 ccw(c3.25,0) 4.406,-1.508 ; -4.406,1.508 cw(c-3.25,0) -3.25,1.9 ; -3.211,1.9 3.25,1.9 cw(c3.25,0) 4.406,1.508
Mechanical 8:
  lines w0.1: -5.75,0 -4.75,0 -4.75,-1 ; -1,0 0,0 0,-1 ; 3.75,0 4.75,0 4.75,-1 ; -7.5,-1 -7.5,1 -2,1 -2,-1 -7.5,-1 ; 2,-1 7.5,-1 7.5,1 2,1 2,-1
Mechanical 14:
  lines w0.1: -5.8,-0.3 -6.7,-0.3 -6.7,0.3 -5.8,0.3 ; -5.15,0 ccw(c-3.25,0) -3.25,-1.9 ; 5.15,0 cw(c3.25,0) 3.25,-1.9 ; 5.8,-0.3 6.7,-0.3 6.7,0.3 5.8,0.3 ; -3.25,-1.9 cw(c-3.25,0) -3.25,1.9 3.25,1.9 cw(c3.25,0) 3.25,-1.9 ; -3.25,-1.9 3.25,-1.9 ; -5.8,-2.45 -5.8,2.45 5.8,2.45 5.8,-2.45 -5.8,-2.45 ; -3.25,-2.4 cw(c-3.25,0) -3.25,2.4 3.25,2.4 cw(c3.25,0) 3.25,-2.4 -3.25,-2.4
Mechanical 15:
  lines w0.05: -7.75,-2.7 -7.75,2.7 7.75,2.7 7.75,-2.7 -7.75,-2.7
3D body "XTAL_1160X490X430.stp": height 4.3, standoff 0, extent -7.15,-2.45 7.15,2.45

## XTAL_ABRACON_ABLSG [mm] "HC/49US (AT49) SMD Cristal, Body 11.4x4.7mm, ABLSG Serie"
height 4.3
pads (3):
  rect 5.6x2.1 smd: 1(-4.75,0) 2(4.75,0)
  rect 2.1x4 smd: 3(0,-0.95)
Top Overlay:
  lines w0.2: -5.8,-1.45 -5.8,-2.45 -1.45,-2.45 ; -5.8,1.45 -5.8,2.45 5.8,2.45 5.8,1.45 ; -5.036,-1.45 ccw(c-3.25,0) -3.25,-2.3 -1.45,-2.3 ; -5.035,1.45 cw(c-3.25,0) -3.25,2.299 ; -3.25,2.3 3.25,2.3 cw(c3.25,0) 5.035,1.45 ; 1.45,-2.45 5.8,-2.45 5.8,-1.45 ; 1.45,-2.3 3.25,-2.3 ccw(c3.25,0) 5.035,-1.45
Mechanical 8:
  lines w0.1: -5.75,0 -4.75,0 ; -5.25,0 -4.75,0 ; -4.75,-1 -4.75,0 ; -4.75,-0.5 -4.75,0 ; -4.75,0.5 -4.75,0 ; -4.75,1 -4.75,0 ; -4.25,0 -4.75,0 ; -3.75,0 -4.75,0 ; -1,-0.95 0,-0.95 ; -1,0 0,0 ; 0,-1.95 0,-0.95 ; 0,1 0,0 ; 1,-0.95 0,-0.95 ; 1,0 0,0 ; 3.75,0 4.75,0 ; 4.25,0 4.75,0 ; 4.75,-1 4.75,0 ; 4.75,-0.5 4.75,0 ; 4.75,0.5 4.75,0 ; 4.75,1 4.75,0 ; 5.25,0 4.75,0 ; 5.75,0 4.75,0 ; -7.55,-1.05 -7.55,1.05 -1.95,1.05 -1.95,-1.05 -7.55,-1.05 ; -1.05,-2.95 -1.05,1.05 1.05,1.05 1.05,-2.95 -1.05,-2.95 ; 1.95,-1.05 1.95,1.05 7.55,1.05 7.55,-1.05 1.95,-1.05
Mechanical 14:
  lines w0.1: -5.8,-0.3 -6.6,-0.3 -6.6,0.3 -5.8,0.3 ; -3.25,2.299 ccw(c-3.25,0) -3.25,-2.3 3.25,-2.3 ccw(c3.25,0) 3.25,2.3 -3.25,2.3 ; -0.3,-2.45 -0.3,-2.9 0.3,-2.9 0.3,-2.45 ; 5.8,-0.3 6.6,-0.3 6.6,0.3 5.8,0.3 ; -5.8,-2.45 -5.8,2.45 5.8,2.45 5.8,-2.45 -5.8,-2.45
Mechanical 15:
  lines w0.05: -7.8,-2.7 7.8,-2.7 7.8,2.7 -7.8,2.7 -7.8,-2.7
3D body "XTAL_ABRACON_ABLSG.stp": height 4.2, standoff 0, extent -6.6,-2.9 6.6,2.45

## XTAL_ABRACON_ABM3B [mm] "ABM3B Serie, SMD Cristal, Body 5.x3.2mm"
height 1.1
pads (4):
  rect 1.2x1.8 smd: 1(-1.2,2) 2(-1.2,-2) 3(1.2,-2) 4(1.2,2)
Top Overlay:
  circle w0.25: c-2.325,2.5 r0.125
  lines w0.2: -1.65,-0.8 -1.65,0.8 ; -0.3,-2.55 0.3,-2.55 ; -0.3,2.55 0.3,2.55 ; 1.65,-0.8 1.65,0.8
Mechanical 8:
  lines w0.1: -1.7,-2 -1.2,-2 ; -1.7,2 -1.2,2 ; -1.2,-2.5 -1.2,-2 ; -1.2,-1.5 -1.2,-2 ; -1.2,1.5 -1.2,2 ; -1.2,2.5 -1.2,2 ; -0.7,-2 -1.2,-2 ; -0.7,2 -1.2,2 ; -0.5,0 0,0 ; 0,-0.5 0,0 ; 0,0.5 0,0 ; 0.5,0 0,0 ; 0.7,-2 1.2,-2 ; 0.7,2 1.2,2 ; 1.2,-2.5 1.2,-2 ; 1.2,-1.5 1.2,-2 ; 1.2,1.5 1.2,2 ; 1.2,2.5 1.2,2 ; 1.7,-2 1.2,-2 ; 1.7,2 1.2,2 ; -1.8,-2.9 -1.8,-1.1 -0.6,-1.1 -0.6,-2.9 -1.8,-2.9 ; -1.8,1.1 -1.8,2.9 -0.6,2.9 -0.6,1.1 -1.8,1.1 ; 0.6,-2.9 1.8,-2.9 1.8,-1.1 0.6,-1.1 0.6,-2.9 ; 0.6,1.1 0.6,2.9 1.8,2.9 1.8,1.1 0.6,1.1
Mechanical 14:
  circle w0.1: c-0.925,1.825 r0.5
  lines w0.1: -1.65,2.25 -1.35,2.55 ; -1.65,2.25 -1.35,2.55 ; -1.65,2.25 -1.65,-2.25 -1.35,-2.55 1.35,-2.55 1.65,-2.25 1.65,2.25 1.35,2.55 -1.35,2.55
Mechanical 15:
  lines w0.05: -2.05,-3.15 -2.05,3.15 2.05,3.15 2.05,-3.15 -2.05,-3.15
3D body "XTAL_ABRACON_ABM3B.stp": height 1.1, standoff 0, extent -1.65,-2.55 1.65,2.55